# Altium footprint library Pcb-hionyPcbLib.PcbLib: 580 footprints (part 20 of 37)
Each footprint in its own frame and in the unit in brackets; x right, y up, seen from the top. Pads: shape width x height; smd on the part's side, far side on the other; paste and mask are expansions set on the pad; w line width, h text height; cw(c..) or ccw(c..) is an arc to the next point about the centre after c.
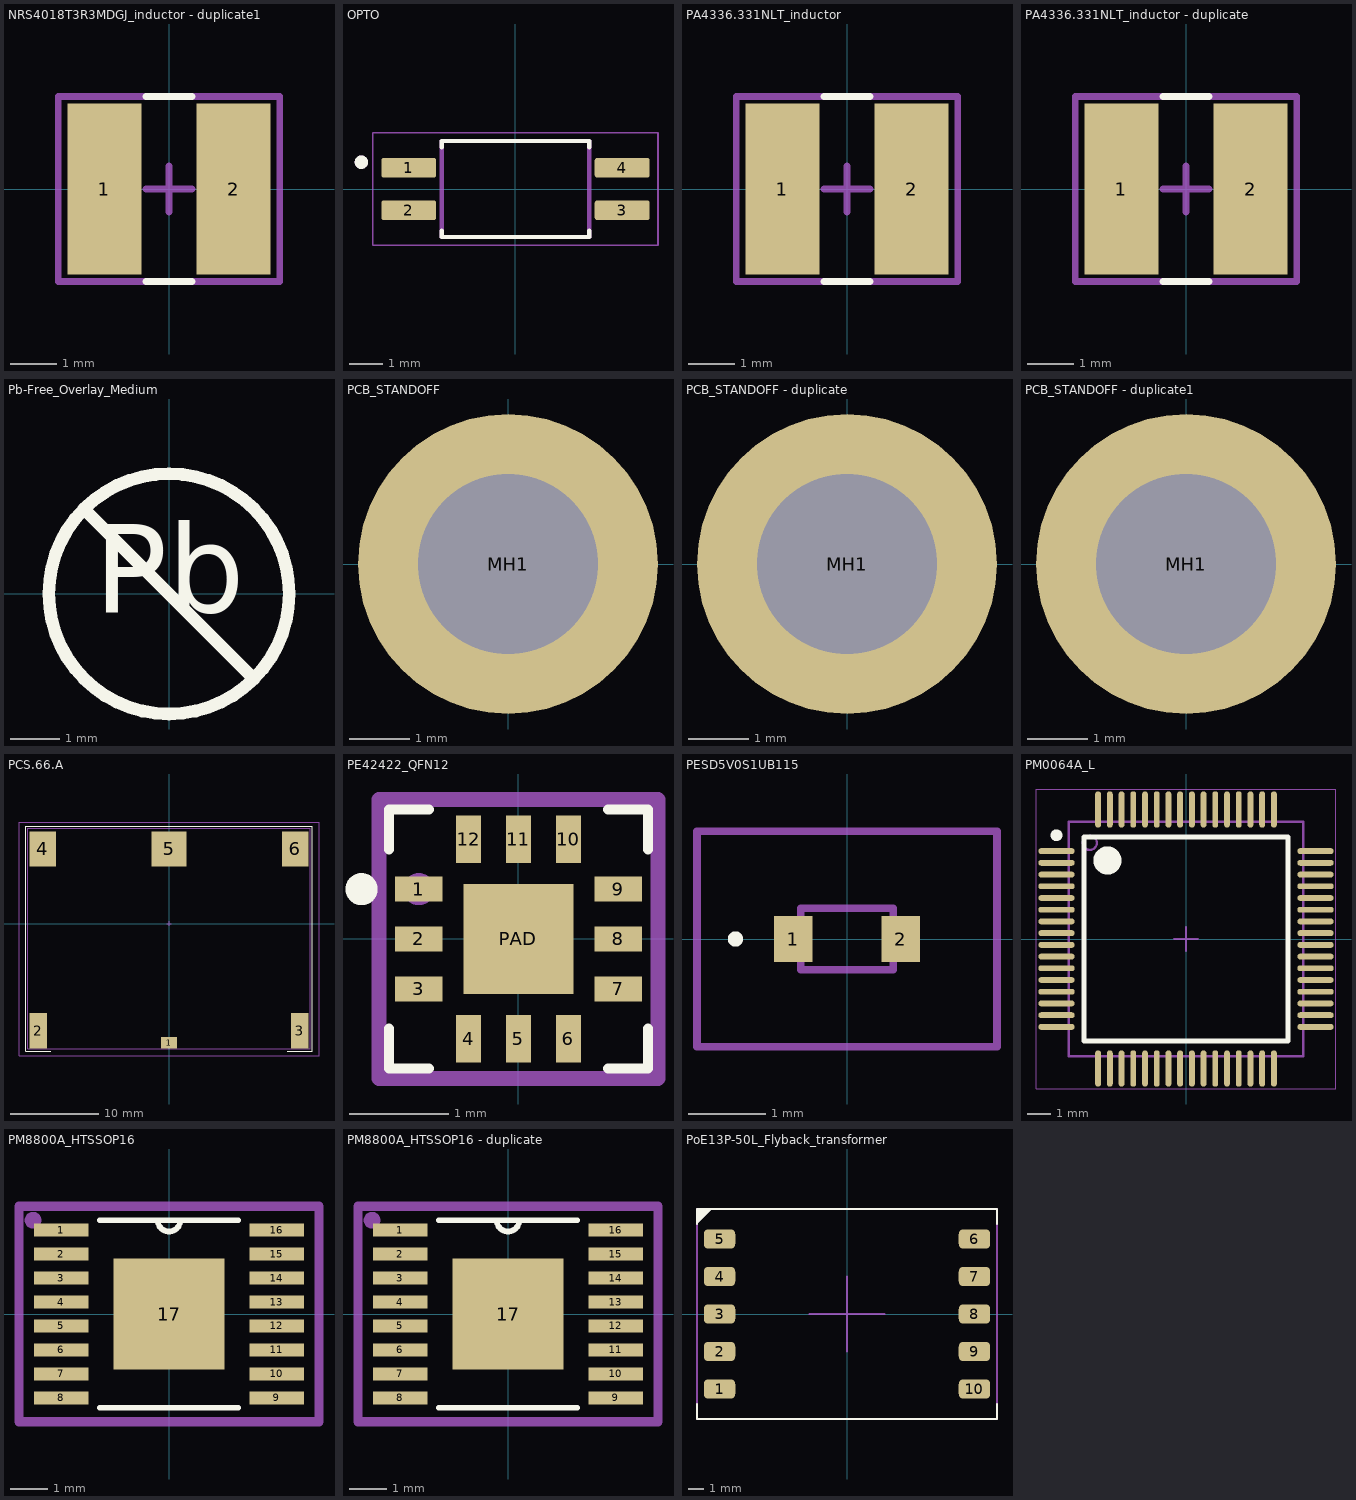
[diagram p19: the footprints below, top view; thin cyan lines are the x and y axes]

## NRS4018T3R3MDGJ_inductor - duplicate1 [mm]
pads (2):
  rect 1.6x3.7 smd mask+0.05: 1(-1.4,0) 2(1.4,0)
Top Overlay:
  lines w0.15: -0.5,-2 0.5,-2 ; -0.5,2 0.5,2
Mechanical 15:
  lines w0.15: -0.5,0 0.5,0 ; 0,-0.5 0,0.5 ; -2.4,-2 2.4,-2 2.4,2 -2.4,2 -2.4,-2
  text ".Designator" at -0.75,0.65 h0.55
  text "No polarity" at -1.6,-1.7 h0.3
3D body "User Library-nr3015_4x4.STEP": height 1.89, standoff -0.11, extent -2,-1.998 2.001,2.002

## OPTO [mm]
pads (4):
  rrect25% 1.64x0.59 smd: 1(-3.185,0.635) 2(-3.185,-0.635) 3(3.185,-0.635) 4(3.185,0.635)
Top Overlay:
  circle w0.2: c-4.6,0.8 r0.1
  lines w0.127: -2.2,-1.245 -2.2,-1.43 2.2,-1.43 2.2,-1.245 ; -2.2,1.245 -2.2,1.43 2.2,1.43 2.2,1.245
Mechanical 13:
  circle w0.2: c-4.6,0.8 r0.1
  lines w0.127: -2.2,-1.43 2.2,-1.43 2.2,1.43 -2.2,1.43 -2.2,-1.43
Mechanical 15:
  lines w0.05: -4.255,-1.68 4.255,-1.68 4.255,1.68 -4.255,1.68 -4.255,-1.68
3D body "TCMT1100.STEP": height 2.1, standoff 0, extent -3.373,-1.3 3.627,1.3

## PA4336.331NLT_inductor [mm]
pads (2):
  rect 1.6x3.7 smd mask+0.05: 1(-1.4,0) 2(1.4,0)
Top Overlay:
  lines w0.15: -0.5,-2 0.5,-2 ; -0.5,2 0.5,2
Mechanical 15:
  lines w0.15: -0.5,0 0.5,0 ; 0,-0.5 0,0.5 ; -2.4,-2 -2.4,2 2.4,2 2.4,-2 -2.4,-2
  text ".Designator" at 0.65,1.475 h0.55
  text "No polarity" at 1.55,-1.125 h0.3
3D body "User Library-nr3015_4x4.STEP": height 1.89, standoff -0.11, extent -2,-1.998 2.001,2.002

## PA4336.331NLT_inductor - duplicate [mm]
pads (2):
  rect 1.6x3.7 smd mask+0.05: 1(-1.4,0) 2(1.4,0)
Top Overlay:
  lines w0.15: -0.5,-2 0.5,-2 ; -0.5,2 0.5,2
Mechanical 15:
  lines w0.15: -0.5,0 0.5,0 ; 0,-0.5 0,0.5 ; -2.4,-2 2.4,-2 2.4,2 -2.4,2 -2.4,-2
  text "No polarity" at 1.55,-1.125 h0.3
  text ".Designator" at 0.65,1.475 h0.55
3D body "User Library-nr3015_4x4.STEP": height 1.89, standoff -0.11, extent -2,-1.998 2.001,2.002

## Pb-Free_Overlay_Medium [mm]
Top Overlay:
  circle w0.254: c0,0 r2.413
  lines w0.254: -1.706,1.706 1.706,-1.706
  text "Pb" at -1.505,-0.961 h3.05

## PCB_STANDOFF [mm]
pads (1):
  round 5 hole 3: MH1(0,0)
Top Paste:
  drawing of 32 lines, arcs and shapes, not listed
Bottom Paste:
  drawing of 32 lines, arcs and shapes, not listed
Mechanical 15:
  lines w0.15: -2.2,0 0,0 ; 0,-2.2 0,0 ; 0,2.2 0,0 ; 2.2,0 0,0
  text ".Designator" at -1.225,-0.425 h0.55
3D body "Hex Spacer MF M3 L5mm.stp": height 5.2, standoff -5.8, extent -2.862,-2.5 2.912,2.5

## PCB_STANDOFF - duplicate [mm]
pads (1):
  round 5 hole 3: MH1(0,0)
Top Paste:
  drawing of 32 lines, arcs and shapes, not listed
Bottom Paste:
  drawing of 32 lines, arcs and shapes, not listed
Mechanical 15:
  lines w0.15: -2.2,0 0,0 ; 0,-2.2 0,0 ; 0,2.2 0,0 ; 2.2,0 0,0
  text ".Designator" at -1.125,2.775 h0.55
3D body "Hex Spacer MF M3 L5mm.stp": height 5.2, standoff -5.8, extent -2.862,-2.5 2.912,2.5

## PCB_STANDOFF - duplicate1 [mm]
pads (1):
  round 5 hole 3: MH1(0,0)
Top Paste:
  drawing of 32 lines, arcs and shapes, not listed
Bottom Paste:
  drawing of 32 lines, arcs and shapes, not listed
Mechanical 15:
  lines w0.15: -2.2,0 0,0 ; 0,-2.2 0,0 ; 0,2.2 0,0 ; 2.2,0 0,0
  text ".Designator" at -1.125,2.775 h0.55
3D body "Hex Spacer MF M3 L5mm.stp": height 5.2, standoff -5.8, extent -2.862,-2.5 2.912,2.5

## PCBComponent_1 [mm]

## PCS.66.A [mm]
pads (6):
  rect 1.85x1.3 smd paste-0.1: 1(0,-13.5)
  rect 2x4 smd paste-0.2: 2(-14.8,-12.15) 3(14.8,-12.15)
  rect 3x4 smd paste-0.25: 4(-14.3,8.45) 6(14.3,8.45)
  rect 4x4 smd paste-0.3: 5(0,8.45)
Top Overlay:
  lines w0.127: -13.4,-14.45 -16.25,-14.45 -16.25,11.05 16.25,11.05 16.25,-14.45 13.4,-14.45
Mechanical 11:
  text ".Designator" at 0.127,0.339 h0.64
Mechanical 13:
  lines w0.127: -16,-14.2 -16,10.8 16,10.8 16,-14.2 -16,-14.2
Mechanical 15:
  lines w0.05: -0.25,0 0.25,0 ; 0,-0.25 0,0.25 ; 0,-0.1 0,0.1 ; -17,-15 -17,11.5 17,11.5 17,-15 -17,-15
3D body "PCS.66.A_web.STEP": height 1.71, standoff 0.01, extent -16.028,-14.235 15.978,10.775

## PE42422_QFN12 [mm]
pads (13):
  rect 0.475x0.25 smd mask+0.05: 1(-1,0.5) 2(-1,0) 3(-1,-0.5) 7(1,-0.5) 8(1,0) 9(1,0.5)
  rect 0.25x0.475 smd mask+0.05: 4(-0.5,-1) 5(0,-1) 6(0.5,-1) 10(0.5,1) 11(0,1) 12(-0.5,1)
  rect 1.1x1.1 smd mask+0.05: PAD(0,0)
Top Overlay:
  circle w0.25: c-1.575,0.5 r0.035
  lines w0.1: -1.3,-0.9 -1.3,-1.3 -0.9,-1.3 ; -1.3,0.9 -1.3,1.3 -0.9,1.3 ; 0.9,-1.3 1.3,-1.3 1.3,-0.9 ; 0.9,1.3 1.3,1.3 1.3,0.9
Mechanical 15:
  circle w0.25: c-1,0.5 r0.035
  lines w0.15: -0.2,0 0.2,0 ; 0,-0.2 0,0.2 ; -1.4,-1.4 -1.4,1.4 1.4,1.4 1.4,-1.4 -1.4,-1.4
  text ".Designator" at -0.965,-1.1 h0.55
3D body: height 0.55, standoff 0, extent -1,-1 1,1
3D body: height 0.58, standoff 0.53, extent -0.873,0.476 -0.475,0.875

## PESD5V0S1UB115 [mm]
pads (2):
  rect 0.5x0.6 smd: 1(-0.7,0) 2(0.7,0)
Top Overlay:
  lines w0.1: -1.5,0 cw(c-1.45,0) -1.4,0 cw(c-1.45,0) -1.5,0
Mechanical 15:
  lines w0.1: -0.6,-0.4 -0.6,0.4 0.6,0.4 0.6,-0.4 -0.6,-0.4
Mechanical 20:
  lines w0.1: -1.95,-1.4 -1.95,1.4 1.95,1.4 1.95,-1.4 -1.95,-1.4
3D body "PESD5V0S1UB,115.stp": height 0.59, standoff -0.02, extent -0.8,-0.449 0.8,0.381

## PM0064A_L [mm]
pads (64):
  oval 1.55x0.25 smd: 1(-5.525,3.75) 2(-5.525,3.25) 3(-5.525,2.75) 4(-5.525,2.25) 5(-5.525,1.75) 6(-5.525,1.25) 7(-5.525,0.75) 8(-5.525,0.25) 9(-5.525,-0.25) 10(-5.525,-0.75) 11(-5.525,-1.25) 12(-5.525,-1.75) 13(-5.525,-2.25) 14(-5.525,-2.75) 15(-5.525,-3.25) 16(-5.525,-3.75) 33(5.525,-3.75) 34(5.525,-3.25) 35(5.525,-2.75) 36(5.525,-2.25) 37(5.525,-1.75) 38(5.525,-1.25) 39(5.525,-0.75) 40(5.525,-0.25) 41(5.525,0.25) 42(5.525,0.75) 43(5.525,1.25) 44(5.525,1.75) 45(5.525,2.25) 46(5.525,2.75) 47(5.525,3.25) 48(5.525,3.75)
  oval 0.25x1.55 smd: 17(-3.75,-5.525) 18(-3.25,-5.525) 19(-2.75,-5.525) 20(-2.25,-5.525) 21(-1.75,-5.525) 22(-1.25,-5.525) 23(-0.75,-5.525) 24(-0.25,-5.525) 25(0.25,-5.525) 26(0.75,-5.525) 27(1.25,-5.525) 28(1.75,-5.525) 29(2.25,-5.525) 30(2.75,-5.525) 31(3.25,-5.525) 32(3.75,-5.525) 49(3.75,5.525) 50(3.25,5.525) 51(2.75,5.525) 52(2.25,5.525) 53(1.75,5.525) 54(1.25,5.525) 55(0.75,5.525) 56(0.25,5.525) 57(-0.25,5.525) 58(-0.75,5.525) 59(-1.25,5.525) 60(-1.75,5.525) 61(-2.25,5.525) 62(-2.75,5.525) 63(-3.25,5.525) 64(-3.75,5.525)
Top Overlay:
  circle w0.6: c-3.35,3.35 r0.3
  circle w0.25: c-5.525,4.425 r0.125
  lines w0.2: -4.35,-4.35 4.35,-4.35 4.35,4.35 -4.35,4.35 -4.35,-4.35
Top 3D Body:
  circle w0.1: c-4.1,4.1 r0.3
  lines w0.1: -5,-5 5,-5 5,5 -5,5 -5,-5
  text ".Designator" at -1.854,-0.508 h1.02
Mechanical 15:
  lines w0.05: -6.4,-6.4 6.4,-6.4 6.4,6.4 -6.4,6.4 -6.4,-6.4
  lines w0.1: -0.5,0 0.5,0 ; 0,-0.5 0,0.5
3D body: height 1.6, standoff 0, extent -5,-5 5,5
3D body: height 1.61, standoff 1, extent -4.399,3.801 -3.801,4.399

## PM8800A_HTSSOP16 [mil]
pads (17):
  rect 58x14 smd: 1(-115,89.57) 2(-115,63.98) 3(-115,38.39) 4(-115,12.8) 5(-115,-12.8) 6(-115,-38.39) 7(-115,-63.98) 8(-115,-89.57) 9(115,-89.57) 10(115,-63.98) 11(115,-38.39) 12(115,-12.8) 13(115,12.8) 14(115,38.39) 15(115,63.98) 16(115,89.57)
  rect 118.11x118.11 smd: 17(0,0)
Top Overlay:
  lines w6: -74,-100 74,-100 ; -74,100 -12,100 ; 74,100 12,100 ; -12,100 ccw(c0,100) 12,100 ; -12,100 12,100
Mechanical 15:
  circle w10: c-145,100 r3.94
  lines w10: -160,-115 160,-115 160,115 -160,115 -160,-115
  text ".Designator" at -36.42,-55.12 h21.65
3D body "User Library-TSSOP-16-1.step": height 43.31, standoff 0, extent -125.98,-98.42 125.99,98.44

## PM8800A_HTSSOP16 - duplicate [mil]
pads (17):
  rect 58x14 smd: 1(-115,89.57) 2(-115,63.98) 3(-115,38.39) 4(-115,12.8) 5(-115,-12.8) 6(-115,-38.39) 7(-115,-63.98) 8(-115,-89.57) 9(115,-89.57) 10(115,-63.98) 11(115,-38.39) 12(115,-12.8) 13(115,12.8) 14(115,38.39) 15(115,63.98) 16(115,89.57)
  rect 118.11x118.11 smd: 17(0,0)
Top Overlay:
  lines w6: -74,-100 74,-100 ; -74,100 -12,100 ; 74,100 12,100 ; -12,100 ccw(c0,100) 12,100 ; -12,100 12,100
Mechanical 15:
  circle w10: c-145,100 r3.94
  lines w10: -160,-115 160,-115 160,115 -160,115 -160,-115
  text ".Designator" at -36.42,-55.12 h21.65
3D body "User Library-TSSOP-16-1.step": height 43.31, standoff 0, extent -125.98,-98.42 125.99,98.44

## PoE13P-50L_Flyback_transformer [mm]
pads (10):
  rrect50% 2.1x1.3 smd mask+0.05: 1(-8.5,-5) 2(-8.5,-2.5) 3(-8.5,0) 4(-8.5,2.5) 5(-8.5,5) 6(8.5,5) 7(8.5,2.5) 8(8.5,0) 9(8.5,-2.5) 10(8.5,-5)
Top Overlay:
  region: -10,6 -9,7 -10,7
  lines w0.15: -10,-6 -10,-7 10,-7 10,-6 ; -10,6 -10,7 10,7 10,6
Mechanical 15:
  lines w0.15: -2.5,0 2.5,0 ; 0,-2.5 0,2.5 ; -10,-7 10,-7 10,7 -10,7 -10,-7
  text "10" at 9.075,-5.65 h0.55
  text "5" at -8.4,4.85 h0.55
  text "6" at 9,4.55 h0.55
  text "1" at -8.275,-5.375 h0.55
  text ".Designator" at 0.975,3.875 h0.55
3D body "Coilcraft-POE13P-50L.step": height 12.7, standoff 0, extent -8.875,-6.73 8.875,6.73